# Altium footprint library Inverter_2kW.PcbLib: 61 footprints (part 1 of 4)
Each footprint in its own frame and in the unit in brackets; x right, y up, seen from the top. Pads: shape width x height; smd on the part's side, far side on the other; paste and mask are expansions set on the pad; w line width, h text height; cw(c..) or ccw(c..) is an arc to the next point about the centre after c.
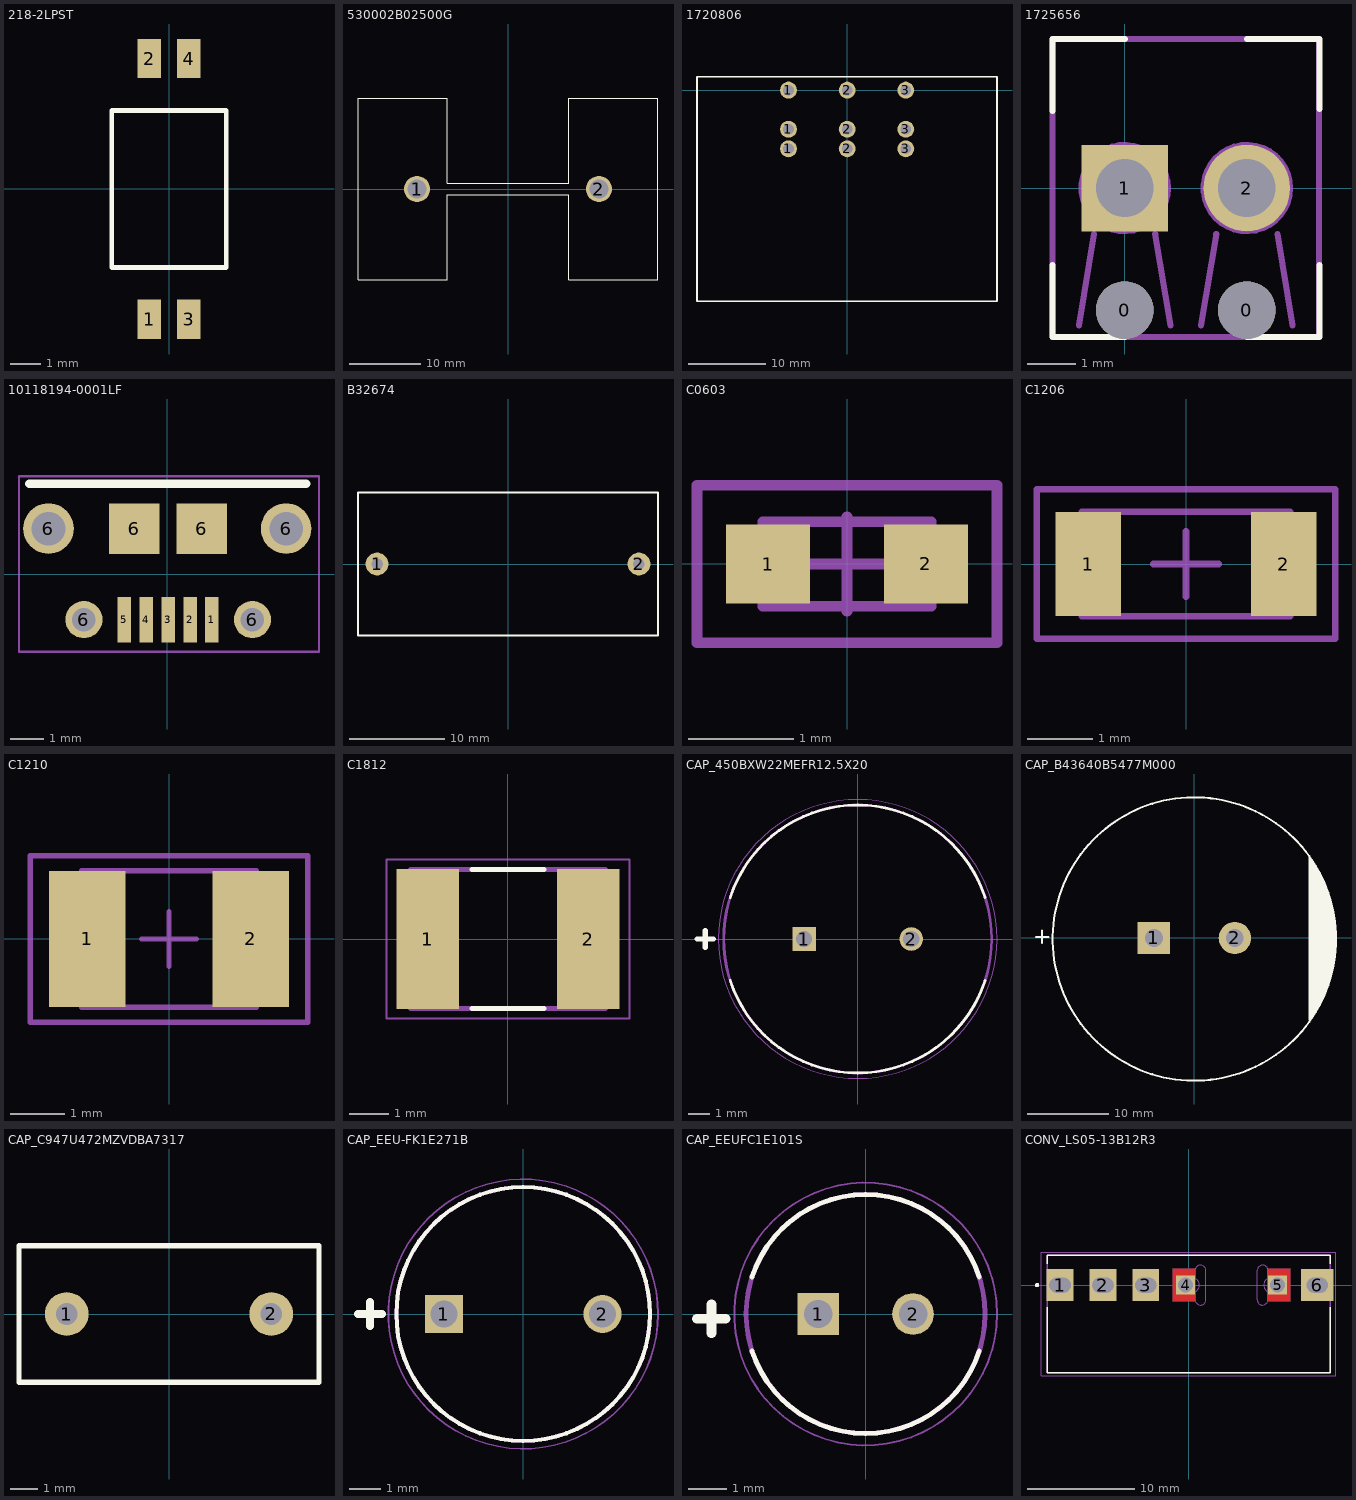
[diagram p0: the footprints below, top view; thin cyan lines are the x and y axes]

## 218-2LPST [mm]
height 1.1
pads (4):
  rect 0.76x1.27 smd: 1(-0.635,-4.22) 2(-0.635,4.22) 4(0.635,4.22)
  rect 0.76x1.274 smd: 3(0.635,-4.22)
Top Overlay:
  lines w0.152: -1.855,-2.54 -1.855,2.54 1.855,2.54 1.855,-2.54 -1.855,-2.54
3D body: height 2.65, standoff 0, extent -1.855,-2.54 1.855,2.54
3D body: height 0.55, standoff 0.35, extent -0.889,2.54 -0.381,3.175
3D body: height 0.55, standoff 0, extent -0.889,3.175 -0.381,3.429
3D body: height 0.2, standoff 0, extent -0.889,3.429 -0.381,4.22
3D body: height 0.2, standoff 0, extent 0.381,3.429 0.889,4.22
3D body: height 0.55, standoff 0, extent 0.381,3.175 0.889,3.429
3D body: height 0.55, standoff 0.35, extent 0.381,2.54 0.889,3.175
3D body: height 0.2, standoff 0, extent -0.889,-4.22 -0.381,-3.429
3D body: height 0.55, standoff 0, extent -0.889,-3.429 -0.381,-3.175
3D body: height 0.55, standoff 0.35, extent -0.889,-3.175 -0.381,-2.54
3D body: height 0.2, standoff 0, extent 0.381,-4.22 0.889,-3.429
3D body: height 0.55, standoff 0, extent 0.381,-3.429 0.889,-3.175
3D body: height 0.55, standoff 0.35, extent 0.381,-3.175 0.889,-2.54

## 530002B02500G [mil]
height 531.5
pads (2):
  round 143 hole 103: 1(-500,0) 2(500,0)
Top Overlay:
  lines w5: -825,-500 -335,-500 -335,-31 335,-31 335,-500 825,-500 825,500 335,500 335,31 -335,31 -335,500 -825,500 -825,-500
3D body "step_temp.STEP": height 2500, standoff -155.91, extent -825,-500 825,500

## 1720806 [mm] "Pluggable Terminal Blocks 3 Pos 7.62mm pitch Through Hole Header"
pads (9):
  round 2.2 hole 1.4: 1(-7.62,-7.62) 1(-7.62,-5.08) 1(-7.62,0) 2(0,-7.62) 2(0,-5.08) 2(0,0) 3(7.62,-7.62) 3(7.62,-5.08) 3(7.62,0)
Top Overlay:
  lines w0.2: -19.501,-27.432 19.459,-27.432 19.459,1.757 -19.501,1.757 -19.501,-27.432
3D body "1720806.stp": height 15.12, standoff -4.17, extent -19.48,-27.472 19.48,1.778

## 1725656 [mm]
height 46
pads (4):
  round 1.2 hole 1.2: 0(0,-2.54) 0(2.54,-2.54)
  rect 1.8x1.8 hole 1.2: 1(0,0)
  round 1.8 hole 1.2: 2(2.54,0)
Top Overlay:
  lines w0.127: -1.5,-1.6 -1.5,-3.1 0,-3.1 ; -1.5,1.6 -1.5,3.1 0,3.1 ; 2.55,-3.1 4.05,-3.1 4.05,-1.6 ; 2.55,3.1 4.05,3.1 4.05,1.65
Mechanical 13:
  circle w0.127: c2.54,0 r0.898
  circle w0.127: c0,0 r0.898
  lines w0.127: -0.952,-2.858 -0.635,-0.953 ; -0.635,-0.635 0.635,0.635 ; 0.635,-0.953 0.953,-2.858 ; 1.588,-2.858 1.905,-0.953 ; 1.905,-0.635 3.175,0.635 ; 3.175,-0.953 3.493,-2.858 ; -1.5,-3.1 4.04,-3.1 4.04,3.1 -1.5,3.1 -1.5,-3.1
3D body "1725656.stp": height 8.5, standoff -3.5, extent -1.5,-3.099 4.04,3.101

## 10118194-0001LF [mm] "CONN USB MICRO B RECPT SMT R/A"
height 13.5
pads (11):
  rect 0.4x1.35 smd: 1(1.325,-1.35) 2(0.675,-1.35) 3(0.025,-1.35) 4(-0.625,-1.35) 5(-1.275,-1.35)
  round 1.5 hole 1: 6(-3.525,1.35) 6(3.525,1.35)
  round 1.1 hole 0.7: 6(-2.475,-1.35) 6(2.525,-1.35)
  rect 1.5x1.5 smd: 6(-0.975,1.35) 6(1.025,1.35)
Top Overlay:
  lines w0.25: -4.1,2.675 4.125,2.675
Mechanical 15:
  lines w0.07: -4.4,-2.3 -4.4,2.9 4.5,2.9 4.5,-2.3 -4.4,-2.3
3D body "MICRO_USB_5PIN_0921_ASM.STEP": height 2.73, standoff -0.55, extent -4,-1.553 4.05,4.027

## B32674 [mm]
height 46
pads (2):
  round 2.4 hole 1.2: 1(-13.75,0) 2(13.75,0)
Top Overlay:
  lines w0.2: -15.75,-7.5 -15.75,7.5 15.75,7.5 15.75,-7.5 -15.75,-7.5
3D body: height 24.5, standoff 0, extent -15.75,-7.5 15.75,7.5

## C0603 [mm] "CAPACITOR SMD 0603"
height 0.9
pads (2):
  rect 0.8x0.75 smd: 1(-0.75,0) 2(0.75,0)
Mechanical 13:
  lines w0.1: -0.8,-0.4 0.8,-0.4 0.8,0.4 -0.8,0.4 -0.8,-0.4
Mechanical 15:
  lines w0.1: -0.45,0 0.45,0 ; 0,-0.45 0,0.45 ; -1.425,-0.75 1.425,-0.75 1.425,0.75 -1.425,0.75 -1.425,-0.75
3D body "User Library-0603(1608M) Cap.STEP": height 0.79, standoff 0, extent -1,-0.394 1,0.394

## C1206 [mm] "CAPACITOR SMD 1206"
height 0.94
pads (2):
  rect 1x1.6 smd: 1(-1.5,0) 2(1.5,0)
Mechanical 13:
  lines w0.1: -1.6,-0.8 1.6,-0.8 1.6,0.8 -1.6,0.8 -1.6,-0.8
Mechanical 15:
  lines w0.1: -0.5,0 0.5,0 ; 0,-0.5 0,0.5 ; -2.286,-1.143 2.286,-1.143 2.286,1.143 -2.286,1.143 -2.286,-1.143
3D body "User Library-1206(3216M) Cap.STEP": height 1.53, standoff 0, extent -2,-0.8 2,0.8

## C1210 [mm] "CAPACITOR SMD 1210"
height 0.94
pads (2):
  rect 1.4x2.5 smd: 1(-1.5,0) 2(1.5,0)
Mechanical 13:
  lines w0.1: -1.6,-1.25 1.6,-1.25 1.6,1.25 -1.6,1.25 -1.6,-1.25
Mechanical 15:
  lines w0.1: -0.5,0 0.5,0 ; 0,-0.5 0,0.5 ; -2.54,-1.524 -2.54,1.524 2.54,1.524 2.54,-1.524 -2.54,-1.524
3D body "User Library-1210(3225M) Cap.STEP": height 1.7, standoff 0, extent -2,-1.245 2,1.245

## C1812 [mm]
height 1.1
pads (2):
  rect 1.57x3.51 smd: 1(-2.017,0) 2(2.017,0)
Top Overlay:
  lines w0.127: -0.91,-1.75 0.91,-1.75 ; -0.91,1.75 0.91,1.75
Mechanical 13:
  lines w0.127: -2.45,-1.75 2.45,-1.75 2.45,1.75 -2.45,1.75 -2.45,-1.75
Mechanical 15:
  lines w0.05: -3.054,-2.005 3.054,-2.005 3.054,2.005 -3.054,2.005 -3.054,-2.005
3D body "C1812C222JDGACTU.STEP": height 1.1, standoff 0, extent -2.25,-1.6 2.25,1.6

## CAP_450BXW22MEFR12.5X20 [mm]
height 13.5
pads (2):
  rect 1.1x1.1 hole 0.75: 1(-2.5,0)
  round 1.1 hole 0.75: 2(2.5,0)
Top Overlay:
  lines w0.127: -5.944,-1.931 ccw(c0,0) 5.944,-1.931 ; -5.944,1.931 cw(c0,0) 5.944,1.931
  lines w0.254: -7.493,0 -6.731,0 ; -7.112,-0.381 -7.112,0.381
Mechanical 13:
  circle w0.127: c0,0 r6.25
Mechanical 15:
  circle w0.05: c0,0 r6.5
3D body: height 20, standoff 0, extent -6.25,-6.247 6.25,6.247

## CAP_B43640B5477M000 [mm]
height 40
pads (2):
  rect 4x4 hole 2.2: 1(-5,0)
  round 4 hole 2.2: 2(5,0)
Top Overlay:
  circle w0.254: c0,-0.127 r17.5
  lines w0.254: -19.558,0.127 -18.034,0.127 ; -18.796,-0.635 -18.796,0.889 ; 14.224,-10.16 14.224,10.033 ; 14.478,-9.906 14.478,9.652 ; 14.732,-9.525 14.732,9.271 ; 14.986,-9.144 14.986,8.89 ; 15.24,-8.763 15.24,8.382 ; 15.494,-8.255 15.494,8.001 ; 15.748,-7.747 15.748,7.493 ; 16.002,-7.239 16.002,6.858 ; 16.256,-6.604 16.256,6.223 ; 16.383,-6.096 16.383,5.842 ; 16.637,-5.588 16.637,5.207 ; 16.891,-4.699 16.891,4.445 ; 17.018,-3.81 17.018,3.81 ; 17.145,-2.794 17.272,2.667 ; 17.272,-2.159 17.272,2.032
3D body: height 40, standoff 0, extent -17.5,-17.622 17.5,17.368

## CAP_C947U472MZVDBA7317 [mm]
pads (2):
  round 1.6 hole 0.8: 1(-3.75,0) 2(3.75,0)
Top Overlay:
  lines w0.2: -5.5,-2.5 -5.5,2.5 5.5,2.5 5.5,-2.5 -5.5,-2.5
3D body "C947U472MZVDBA7317.step": height 15.5, standoff -19.3, extent -5.5,-2.5 5.5,2.503

## CAP_EEU-FK1E271B [mm]
height 13.5
pads (2):
  rect 1.2x1.2 hole 0.85: 1(-2.5,0)
  round 1.2 hole 0.85: 2(2.5,0)
Top Overlay:
  circle w0.127: c0,0 r4
  lines w0.254: -5.207,0 -4.445,0 ; -4.826,-0.381 -4.826,0.381
Mechanical 13:
  circle w0.127: c0,0 r4
Mechanical 15:
  circle w0.05: c0,0 r4.25
3D body "step_temp.STEP": height 11.5, standoff -17, extent -4,-4 4,4

## CAP_EEUFC1E101S [mm]
height 13.5
pads (2):
  rect 1.1x1.1 hole 0.75: 1(-1.25,0)
  round 1.1 hole 0.75: 2(1.25,0)
Top Overlay:
  lines w0.127: -2.996,-0.973 ccw(c0,0) 2.996,-0.973 ; -2.996,0.973 cw(c0,0) 2.996,0.973
  lines w0.254: -4.445,-0.127 -3.683,-0.127 ; -4.064,-0.508 -4.064,0.254
Mechanical 13:
  circle w0.127: c0,0 r3.15
Mechanical 15:
  circle w0.05: c0,0 r3.463
3D body "step_temp.STEP": height 11.2, standoff -17, extent -3.15,-3.149 3.15,3.149

## CONV_LS05-13B12R3 [mm]
pads (6):
  rect 2.5x3 hole 1.4 slot 2 at 0 deg: 1(-12,0) 2(-8,0) 3(-4,0)
  rect 1.78x1.78 hole 1.4 mask+0: 4(-0.29,0) 5(8.29,0)
  rect 3x3 hole 1.4 slot 2 at 0 deg: 6(12,0)
Top Layer:
  region: 0.6,0.7 -0.3,0.7 -0.337,0.699 -0.373,0.696 -0.41,0.691 -0.446,0.685 -0.481,0.676 -0.516,0.666 -0.551,0.654 -0.585,0.639 -0.618,0.624 -0.65,0.606 -0.681,0.587 -0.711,0.566 -0.741,0.544 -0.768,0.52 -0.795,0.495 -0.82,0.468 -0.844,0.441 -0.866,0.411 -0.887,0.381 -0.906,0.35 -0.924,0.318 -0.939,0.285 -0.954,0.251 -0.966,0.216 -0.976,0.181 -0.985,0.146 -0.991,0.11 -0.996,0.073 -0.999,0.037 -1,0 -0.999,-0.037 -0.996,-0.073 -0.991,-0.11 -0.985,-0.146 -0.976,-0.181 -0.966,-0.216 -0.954,-0.251 -0.939,-0.285 -0.924,-0.318 -0.906,-0.35 -0.887,-0.381 -0.866,-0.411 -0.844,-0.441 -0.82,-0.468 -0.795,-0.495 -0.768,-0.52 -0.741,-0.544 -0.711,-0.566 -0.681,-0.587 -0.65,-0.606 -0.618,-0.624 -0.585,-0.639 -0.551,-0.654 -0.516,-0.666 -0.481,-0.676 -0.446,-0.685 -0.41,-0.691 -0.373,-0.696 -0.337,-0.699 -0.3,-0.7 0.6,-0.7 0.6,-1.5 -1.5,-1.5 -1.5,1.5 0.6,1.5
  region: 9.5,-1.5 7.4,-1.5 7.4,-0.7 8.3,-0.7 8.337,-0.699 8.373,-0.696 8.41,-0.691 8.446,-0.685 8.481,-0.676 8.516,-0.666 8.551,-0.654 8.585,-0.639 8.618,-0.624 8.65,-0.606 8.681,-0.587 8.711,-0.566 8.741,-0.544 8.768,-0.52 8.795,-0.495 8.82,-0.468 8.844,-0.441 8.866,-0.411 8.887,-0.381 8.906,-0.35 8.924,-0.318 8.939,-0.285 8.954,-0.251 8.966,-0.216 8.976,-0.181 8.985,-0.146 8.991,-0.11 8.996,-0.073 8.999,-0.037 9,0 8.999,0.037 8.996,0.073 8.991,0.11 8.985,0.146 8.976,0.181 8.966,0.216 8.954,0.251 8.939,0.285 8.924,0.318 8.906,0.35 8.887,0.381 8.866,0.411 8.844,0.441 8.82,0.468 8.795,0.495 8.768,0.52 8.741,0.544 8.711,0.566 8.681,0.587 8.65,0.606 8.618,0.624 8.585,0.639 8.551,0.654 8.516,0.666 8.481,0.676 8.446,0.685 8.41,0.691 8.373,0.696 8.337,0.699 8.3,0.7 7.4,0.7 7.4,1.5 9.5,1.5
Bottom Layer:
  region: 0.6,0.7 -0.3,0.7 -0.337,0.699 -0.373,0.696 -0.41,0.691 -0.446,0.685 -0.481,0.676 -0.516,0.666 -0.551,0.654 -0.585,0.639 -0.618,0.624 -0.65,0.606 -0.681,0.587 -0.711,0.566 -0.741,0.544 -0.768,0.52 -0.795,0.495 -0.82,0.468 -0.844,0.441 -0.866,0.411 -0.887,0.381 -0.906,0.35 -0.924,0.318 -0.939,0.285 -0.954,0.251 -0.966,0.216 -0.976,0.181 -0.985,0.146 -0.991,0.11 -0.996,0.073 -0.999,0.037 -1,0 -0.999,-0.037 -0.996,-0.073 -0.991,-0.11 -0.985,-0.146 -0.976,-0.181 -0.966,-0.216 -0.954,-0.251 -0.939,-0.285 -0.924,-0.318 -0.906,-0.35 -0.887,-0.381 -0.866,-0.411 -0.844,-0.441 -0.82,-0.468 -0.795,-0.495 -0.768,-0.52 -0.741,-0.544 -0.711,-0.566 -0.681,-0.587 -0.65,-0.606 -0.618,-0.624 -0.585,-0.639 -0.551,-0.654 -0.516,-0.666 -0.481,-0.676 -0.446,-0.685 -0.41,-0.691 -0.373,-0.696 -0.337,-0.699 -0.3,-0.7 0.6,-0.7 0.6,-1.5 -1.5,-1.5 -1.5,1.5 0.6,1.5
  region: 9.5,-1.5 7.4,-1.5 7.4,-0.7 8.3,-0.7 8.337,-0.699 8.373,-0.696 8.41,-0.691 8.446,-0.685 8.481,-0.676 8.516,-0.666 8.551,-0.654 8.585,-0.639 8.618,-0.624 8.65,-0.606 8.681,-0.587 8.711,-0.566 8.741,-0.544 8.768,-0.52 8.795,-0.495 8.82,-0.468 8.844,-0.441 8.866,-0.411 8.887,-0.381 8.906,-0.35 8.924,-0.318 8.939,-0.285 8.954,-0.251 8.966,-0.216 8.976,-0.181 8.985,-0.146 8.991,-0.11 8.996,-0.073 8.999,-0.037 9,0 8.999,0.037 8.996,0.073 8.991,0.11 8.985,0.146 8.976,0.181 8.966,0.216 8.954,0.251 8.939,0.285 8.924,0.318 8.906,0.35 8.887,0.381 8.866,0.411 8.844,0.441 8.82,0.468 8.795,0.495 8.768,0.52 8.741,0.544 8.711,0.566 8.681,0.587 8.65,0.606 8.618,0.624 8.585,0.639 8.551,0.654 8.516,0.666 8.481,0.676 8.446,0.685 8.41,0.691 8.373,0.696 8.337,0.699 8.3,0.7 7.4,0.7 7.4,1.5 9.5,1.5
Top Overlay:
  circle w0.2: c-14.15,0 r0.1
  lines w0.127: -13.2,-2.05 -13.2,-8.2 13.2,-8.2 13.2,-2.05 ; -13.2,2 -13.2,2.8 13.2,2.8 13.2,2
Top Solder:
  region: 1.7,-1.965 0.49,-1.965 0.49,1.965 1.7,1.965
  region: 0.7,0.6 0.7,-0.6 0.7,-1.6 -1.6,-1.6 -1.6,1.6 0.7,1.6
  region: 9.6,-1.6 7.3,-1.6 7.3,-0.6 7.3,0.6 7.3,1.6 9.6,1.6
  region: 7.49,-1.965 6.3,-1.965 6.3,1.965 7.49,1.965
Bottom Solder:
  region: 1.7,-1.965 0.49,-1.965 0.49,1.965 1.7,1.965
  region: 0.7,0.6 0.7,-0.6 0.7,-1.6 -1.6,-1.6 -1.6,1.6 0.7,1.6
  region: 9.6,-1.6 7.3,-1.6 7.3,-0.6 7.3,0.6 7.3,1.6 9.6,1.6
  region: 7.49,-1.965 6.3,-1.965 6.3,1.965 7.49,1.965
Mechanical 1:
  lines w0: 0.6,-1.365 0.6,1.365 ; 0.6,-1.361 ccw(c1.095,-1.37) 1.086,-1.865 ccw(c1.095,-1.36) 1.6,-1.369 ; 0.6,1.361 cw(c1.095,1.37) 1.086,1.865 cw(c1.095,1.36) 1.6,1.369 ; 1.6,-1.365 1.6,1.365 ; 6.4,-1.369 ccw(c6.905,-1.36) 6.914,-1.865 ccw(c6.905,-1.37) 7.4,-1.361 ; 6.4,-1.365 6.4,1.365 ; 6.4,1.369 cw(c6.905,1.36) 6.914,1.865 cw(c6.905,1.37) 7.4,1.361 ; 7.4,-1.365 7.4,1.365 ; -1,0 ccw(c-0.3,0) -0.3,-0.7 0.3,-0.7 ccw(c0.3,0) 1,0 ccw(c0.3,0) 0.3,0.7 -0.3,0.7 ccw(c-0.3,0) -1,0 ; 7,0 ccw(c7.7,0) 7.7,-0.7 8.3,-0.7 ccw(c8.3,0) 9,0 ccw(c8.3,0) 8.3,0.7 7.7,0.7 ccw(c7.7,0) 7,0
Mechanical 13:
  circle w0.2: c-14.15,0 r0.1
  lines w0.127: -13.2,-8.2 -13.2,2.8 13.2,2.8 13.2,-8.2 -13.2,-8.2
Mechanical 15:
  lines w0.05: -13.75,-8.45 -13.75,3.05 13.75,3.05 13.75,-8.45 -13.75,-8.45
3D body "step_temp.STEP": height 14.73, standoff -2.87, extent -13.2,-8.2 13.2,2.8